# Altium footprint library Miscellaneous Devices LC.PcbLib: 733 footprints (part 9 of 46)
Each footprint in its own frame and in the unit in brackets; x right, y up, seen from the top. Pads: shape width x height; smd on the part's side, far side on the other; paste and mask are expansions set on the pad; w line width, h text height; cw(c..) or ccw(c..) is an arc to the next point about the centre after c.
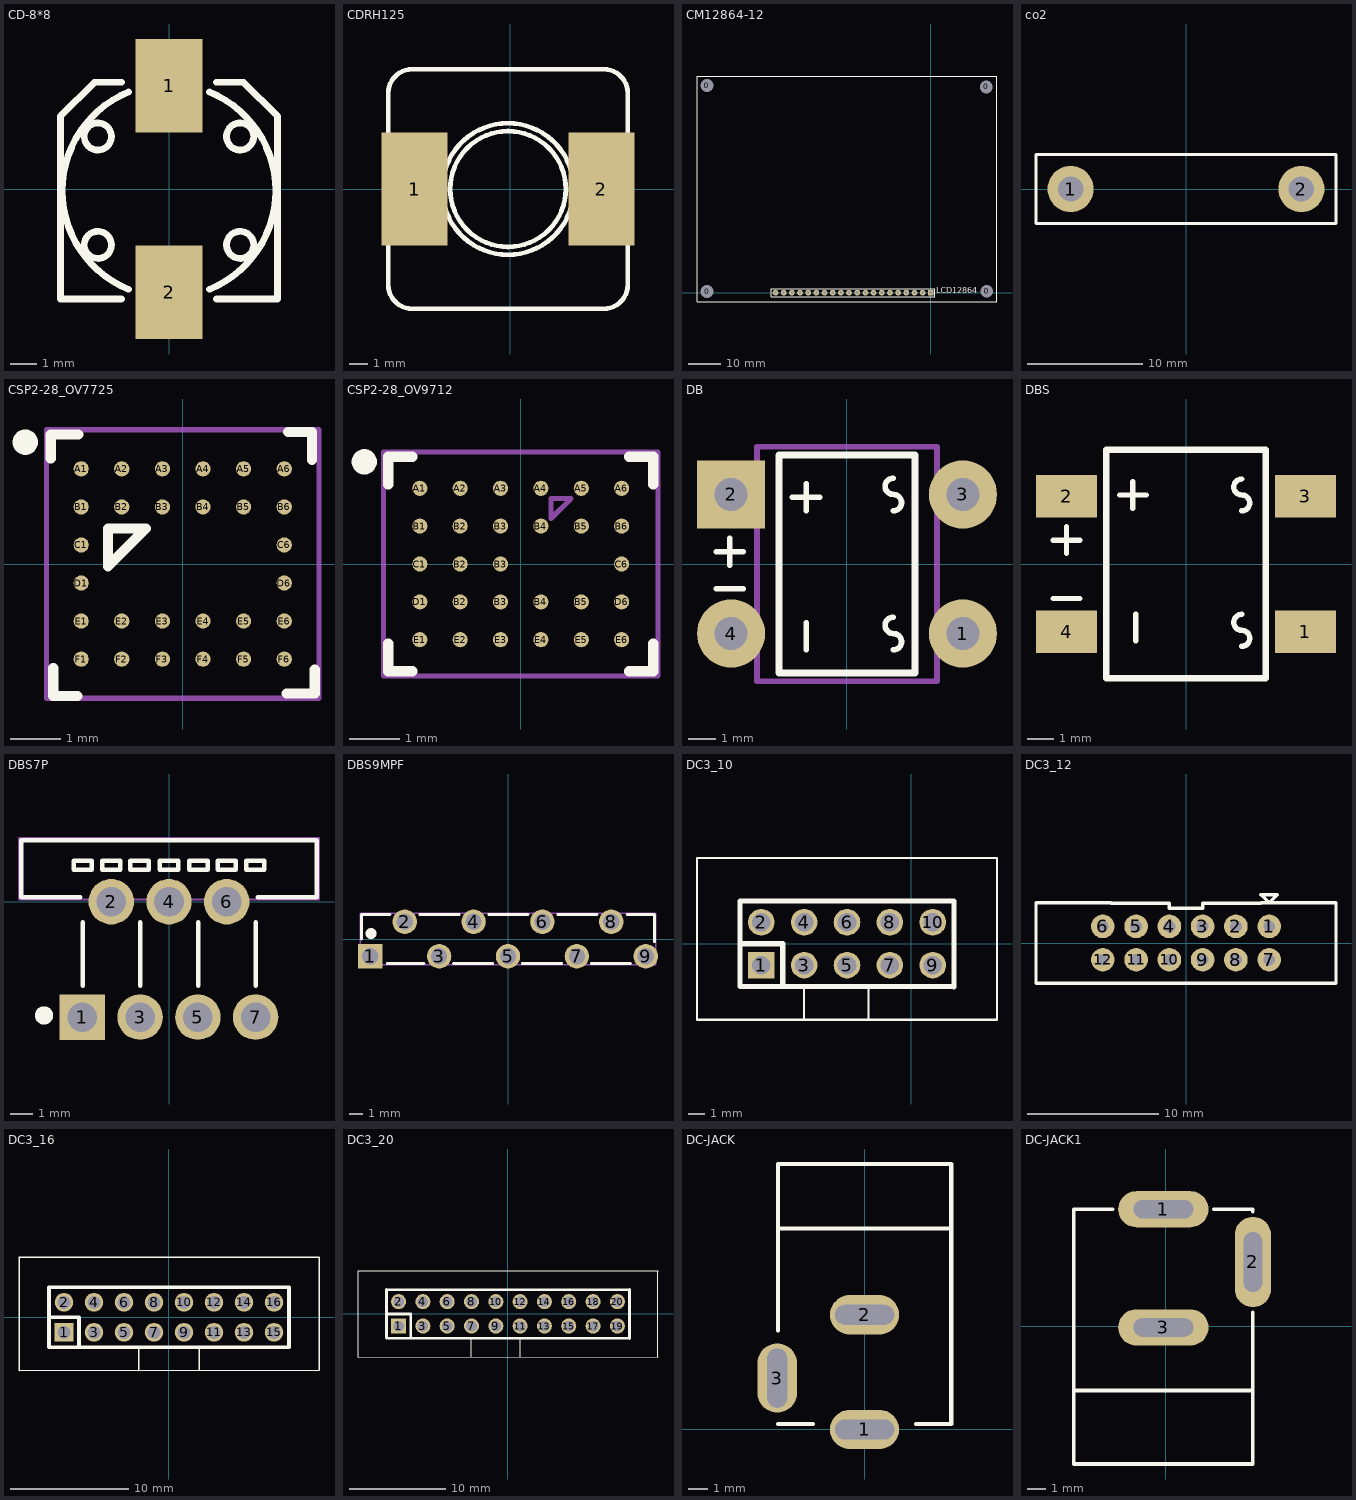
[diagram p8: the footprints below, top view; thin cyan lines are the x and y axes]

## CD-8*8 [mm]
pads (2):
  rect 2.5x3.5 smd: 1(0,3.873) 2(0,-3.873)
Top Overlay:
  circle w0.254: c2.667,1.968 r0.508
  circle w0.254: c-2.667,1.968 r0.508
  circle w0.254: c-2.667,-2.095 r0.508
  circle w0.254: c2.667,-2.095 r0.508
  lines w0.254: -1.778,-4.127 -4.064,-4.127 -4.064,2.73 -2.794,4 -1.778,4 ; -1.523,-3.762 cw(c0,-0.064) -1.523,3.635 ; 1.523,-3.762 ccw(c0,-0.064) 1.523,3.635 ; 1.778,-4.127 4.064,-4.127 4.064,2.73 2.794,4 1.778,4

## CDRH125 [mm]
pads (2):
  rect 3.5x6 smd: 1(-5.08,0) 2(4.826,0)
Top Overlay:
  circle w0.254: c-0.127,0 r3.069
  circle w0.254: c-0.127,0 r3.487
  lines w0.254: -6.477,-5.08 ccw(c-5.207,-5.08) -5.207,-6.35 4.953,-6.35 ccw(c4.953,-5.08) 6.223,-5.08 6.223,5.08 ccw(c4.953,5.08) 4.953,6.35 -5.207,6.35 ccw(c-5.207,5.08) -6.477,5.08 -6.477,-5.08

## CM12864-12 [mil]
pads (24):
  round 118.11 hole 157.48: 0(-2740,2535) 0(-2736.14,12.87) 0(678.86,2517.87) 0(683.86,17.87)
  rect 70x70 hole 38: 1(0,0)
  round 70 hole 38: 2(-100,0) 3(-200,0) 4(-300,0) 5(-400,0) 6(-500,0) 7(-600,0) 8(-700,0) 9(-800,0) 10(-900,0) 11(-1000,0) 12(-1100,0) 13(-1200,0) 14(-1300,0) 15(-1400,0) 16(-1500,0) 17(-1600,0) 18(-1700,0) 19(-1800,0) 20(-1900,0)
Top Overlay:
  lines w7.87: -1950,-50 -25,-50 50,-50 50,50 -1950,50 -1950,-50
  lines w10: -2860.63,-110 810,-110 810,2647.32 -2860.63,2647.32 -2860.63,-110
  text "LCD12864" at 65,-30 h120

## co2 [mm]
pads (2):
  round 4 hole 2.2: 1(-10,0) 2(10,0)
Top Overlay:
  lines w0.254: -13,-3 13,-3 13,3 -13,3 -13,-3

## CSP2-28_OV7725 [mm]
pads (28):
  round 0.3 smd mask+0.051: A1(-2,1.875) A2(-1.2,1.875) A3(-0.4,1.875) A4(0.4,1.875) A5(1.2,1.875) A6(2,1.875) B1(-2,1.125) B2(-1.2,1.125) B3(-0.4,1.125) B4(0.4,1.125) B5(1.2,1.125) B6(2,1.125) C1(-2,0.375) C6(2,0.375) D1(-2,-0.375) D6(2,-0.375) E1(-2,-1.125) E2(-1.2,-1.125) E3(-0.4,-1.125) E4(0.4,-1.125) E5(1.2,-1.125) E6(2,-1.125) F1(-2,-1.875) F2(-1.2,-1.875) F3(-0.4,-1.875) F4(0.4,-1.875) F5(1.2,-1.875) F6(2,-1.875)
Top Overlay:
  circle w0.25: c-3.1,2.4 r0.125
  lines w0.2: -2.6,2.075 -2.6,2.55 -2.05,2.55 ; -2.55,-2.05 -2.55,-2.6 -2.075,-2.6 ; 2.05,-2.55 2.6,-2.55 2.6,-2.075 ; 2.075,2.6 2.55,2.6 2.55,2.05 ; -1.475,-0.05 -1.475,0.7 -0.725,0.7 -1.475,-0.05
Mechanical 13:
  lines w0.1: -2.685,-2.645 2.685,-2.645 2.685,2.645 -2.685,2.645 -2.685,-2.645

## CSP2-28_OV9712 [mm]
pads (28):
  round 0.3 smd mask+0.051: A1(-2,1.5) A2(-1.2,1.5) A3(-0.4,1.5) A4(0.4,1.5) A5(1.2,1.5) A6(2,1.5) B1(-2,0.75) B2(-1.2,-0.75) B2(-1.2,0) B2(-1.2,0.75) B3(-0.4,-0.75) B3(-0.4,0) B3(-0.4,0.75) B4(0.4,-0.75) B4(0.4,0.75) B5(1.2,-0.75) B5(1.2,0.75) B6(2,0.75) C1(-2,0) C6(2,0) D1(-2,-0.75) D6(2,-0.75) E1(-2,-1.5) E2(-1.2,-1.5) E3(-0.4,-1.5) E4(0.4,-1.5) E5(1.2,-1.5) E6(2,-1.5)
Top Overlay:
  circle w0.25: c-3.1,2.025 r0.125
  lines w0.2: -2.625,-1.575 -2.625,-2.125 -2.15,-2.125 ; -2.625,1.575 -2.625,2.125 -2.15,2.125 ; 2.15,-2.125 2.625,-2.125 2.625,-1.575 ; 2.15,2.125 2.625,2.125 2.625,1.575
Mechanical 13:
  lines w0.1: -2.72,-2.22 2.72,-2.22 2.72,2.22 -2.72,2.22 -2.72,-2.22 ; 0.6,0.9 0.6,1.3 1,1.3 0.6,0.9

## DB [mm]
pads (4):
  round 2.5 hole 1.2: 1(4.25,-2.55) 3(4.25,2.55) 4(-4.25,-2.55)
  rect 2.5x2.5 hole 1.2: 2(-4.25,2.55)
Top Overlay:
  lines w0.203: -4.8,-0.9 -3.8,-0.9 ; -4.8,0.45 -3.8,0.45 ; -4.3,-0.05 -4.3,0.95 ; -2,2.45 -1,2.45 ; -1.5,-3.15 -1.5,-2.15 ; -1.5,1.95 -1.5,2.95 ; 1.7,-3.15 ccw(c1.7,-2.85) 1.7,-2.55 cw(c1.7,-2.25) 1.7,-1.95 ; 1.7,1.95 ccw(c1.7,2.25) 1.7,2.55 cw(c1.7,2.85) 1.7,3.15
  lines w0.254: -2.5,-4 -2.5,4 2.5,4 2.5,-4 -2.5,-4
Mechanical 13:
  lines w0.203: -3.3,-4.3 3.3,-4.3 3.3,4.3 -3.3,4.3 -3.3,-4.3

## DBS [mm]
pads (4):
  rect 2.3x1.6 smd: 1(4.5,-2.55) 2(-4.5,2.55) 3(4.5,2.55) 4(-4.5,-2.55)
Top Overlay:
  lines w0.203: -5,-1.3 -4,-1.3 ; -5,0.9 -4,0.9 ; -4.5,0.4 -4.5,1.4 ; -2.5,2.6 -1.5,2.6 ; -2,2.1 -2,3.1 ; -1.9,-2.9 -1.9,-1.9 ; 2.1,-3.1 ccw(c2.1,-2.8) 2.1,-2.5 cw(c2.1,-2.2) 2.1,-1.9 ; 2.1,2 ccw(c2.1,2.3) 2.1,2.6 cw(c2.1,2.9) 2.1,3.2
  lines w0.254: -3,-4.3 -3,4.3 3,4.3 3,-4.3 -3,-4.3

## DBS7P [mm]
pads (7):
  rect 2x2 hole 1.3: 1(-3.81,-5.08)
  round 2 hole 1.3: 2(-2.54,0) 3(-1.27,-5.08) 4(0,0) 5(1.27,-5.08) 6(2.54,0) 7(3.81,-5.08)
Top Overlay:
  circle w0.4: c-5.5,-5 r0.2
  lines w0.2: -4,1.8 -3.6,1.8 ; -3.9,0.2 -6.5,0.2 -6.5,2.7 6.5,2.7 6.5,0.2 3.9,0.2 ; -3.8,-3.7 -3.8,-0.9 ; -2.74,1.8 -2.34,1.8 ; -1.5,1.8 -1.1,1.8 ; -1.26,-3.7 -1.26,-0.9 ; -0.2,1.8 0.2,1.8 ; 1.1,1.8 1.5,1.8 ; 1.28,-3.7 1.28,-0.9 ; 2.34,1.8 2.74,1.8 ; 3.6,1.8 4,1.8 ; 3.82,-3.7 3.82,-0.9 ; -4.2,1.4 -3.4,1.4 -3.4,1.8 -4.2,1.8 -4.2,1.4 ; -2.94,1.4 -2.14,1.4 -2.14,1.8 -2.94,1.8 -2.94,1.4 ; -1.7,1.4 -0.9,1.4 -0.9,1.8 -1.7,1.8 -1.7,1.4 ; -0.4,1.4 -0.4,1.8 0.4,1.8 0.4,1.4 -0.4,1.4 ; 0.9,1.4 1.7,1.4 1.7,1.8 0.9,1.8 0.9,1.4 ; 2.14,1.4 2.94,1.4 2.94,1.8 2.14,1.8 2.14,1.4 ; 3.4,1.4 4.2,1.4 4.2,1.8 3.4,1.8 3.4,1.4
Mechanical 13:
  lines w0.1: -6.6,0.1 6.6,0.1 6.6,2.8 -6.6,2.8 -6.6,0.1

## DBS9MPF [mm]
pads (9):
  rect 1.8x1.8 hole 1.2: 1(-10.16,-1.27)
  round 1.8 hole 1.2: 2(-7.62,1.27) 3(-5.08,-1.27) 4(-2.54,1.27) 5(0,-1.27) 6(2.54,1.27) 7(5.08,-1.27) 8(7.62,1.27) 9(10.16,-1.27)
Top Overlay:
  circle w0.4: c-10.1,0.4 r0.2
  lines w0.2: -10.8,0 -10.8,1.8 -8.7,1.8 ; -8.9,-1.8 -6.2,-1.8 ; -6.5,1.8 -3.6,1.8 ; -4.02,-1.8 -1.12,-1.8 ; -1.42,1.8 1.48,1.8 ; 1.06,-1.8 3.96,-1.8 ; 3.66,1.8 6.56,1.8 ; 6.14,-1.8 9.04,-1.8 ; 8.8,1.8 10.8,1.8 10.8,-0.2
Mechanical 13:
  lines w0.1: -10.9,-1.9 -10.9,1.9 10.9,1.9 10.9,-1.9 -10.9,-1.9

## DC3_10 [mil]
pads (10):
  rect 62x62 hole 43.31: 1(-350,-50)
  round 62 hole 43.31: 2(-350,50) 3(-250,-50) 4(-250,50) 5(-150,-50) 6(-150,50) 7(-50,-50) 8(-50,50) 9(50,-50) 10(50,50)
Top Overlay:
  lines w5: -250.1,-178.1 -250.1,-100.15 ; -100,-177.06 -100,-99.5 ; -500,-177.53 200,-177.39 200,199.96 -500,199.89 -500,-177.53
  lines w12: -400,-100.06 100,-100.36 100,99.6 -400,100 -400,-100 ; -400,0 -300,0 -300,-100

## DC3_12 [mm]
pads (12):
  round 1.8 hole 0.9: 1(6.35,1.27) 2(3.81,1.27) 3(1.27,1.27) 4(-1.27,1.27) 5(-3.81,1.27) 6(-6.35,1.27) 7(6.35,-1.27) 8(3.81,-1.27) 9(1.27,-1.27) 10(-1.27,-1.27) 11(-3.81,-1.27) 12(-6.35,-1.27)
Top Overlay:
  lines w0.254: 6.985,3.683 6.969,3.683 ; 6.969,3.683 5.715,3.683 5.731,3.683 6.35,3.064 6.969,3.683 ; -11.445,-3.064 11.445,-3.064 11.445,3.064 5.723,3.064 5.707,3.048 1.27,3.048 1.27,2.667 -1.27,2.667 -1.27,3.048 -5.707,3.048 -5.723,3.064 -11.445,3.064 -11.445,-3.064

## DC3_16 [mil]
pads (16):
  rect 62x62 hole 43.31: 1(-350,-50)
  round 62 hole 43.31: 2(-350,50) 3(-250,-50) 4(-250,50) 5(-150,-50) 6(-150,50) 7(-50,-50) 8(-50,50) 9(50,-50) 10(50,50) 11(150,-50) 12(150,50) 13(250,-50) 14(250,50) 15(350,-50) 16(350,50)
Top Overlay:
  lines w5: -100.1,-178.1 -100.1,-100.15 ; 100,-177.06 100,-99.5 ; -500,-177.53 500,-177.32 500,199.99 -500,199.89 -500,-177.53
  lines w12: -400,-100.06 400,-100.54 400,99.36 -400,100 -400,-100 ; -400,0 -300,0 -300,-100

## DC3_20 [mil]
pads (20):
  rect 62x62 hole 43.31: 1(-450,-50)
  round 62 hole 43.31: 2(-450,50) 3(-350,-50) 4(-350,50) 5(-250,-50) 6(-250,50) 7(-150,-50) 8(-150,50) 9(-50,-50) 10(-50,50) 11(50,-50) 12(50,50) 13(150,-50) 14(150,50) 15(250,-50) 16(250,50) 17(350,-50) 18(350,50) 19(450,-50) 20(450,50)
Top Overlay:
  lines w5: -150.1,-178.1 -150.1,-100.15 ; 50,-177.06 50,-99.5 ; 617.03,-177.37 617.03,176.97 ; 617.1,-177.3 -616.93,-177.56 -616.93,176.77 617.1,176.9
  lines w12: -500,0 -400,0 -400,-100 ; 500.2,-100.6 500.2,99.4 ; 500.3,-100.6 -500,-100 -500,100 500.3,99.2

## DC-JACK [mm]
pads (3):
  oval 3.5x2 hole 1 slot 3 at 0 deg: 1(0,0) 2(0,5.817)
  oval 2x3.5 hole 1 slot 3 at 90 deg: 3(-4.428,2.609)
Top Overlay:
  lines w0.203: -4.394,0.279 -2.616,0.279 ; -4.394,5.029 -4.394,13.462 4.394,13.462 4.394,0.279 2.616,0.279 ; -4.394,10.185 4.394,10.185

## DC-JACK1 [mm]
pads (3):
  oval 5x2 hole 1.016 slot 3.302 at 0 deg: 1(-0.126,6.479) 3(-0.126,-0.061)
  oval 2x5 hole 1.016 slot 3.302 at 90 deg: 2(4.827,3.558)
Top Overlay:
  lines w0.2: -5.079,-3.554 4.827,-3.554 ; -2.92,6.479 -5.079,6.479 -5.079,-7.618 4.827,-7.618 4.827,0.764 ; 2.668,6.479 4.827,6.479 4.827,6.352